# Altium footprint library PCB_PLC200.PcbLib: 15 footprints
Each footprint in its own frame and in the unit in brackets; x right, y up, seen from the top. Pads: shape width x height; smd on the part's side, far side on the other; paste and mask are expansions set on the pad; w line width, h text height; cw(c..) or ccw(c..) is an arc to the next point about the centre after c.
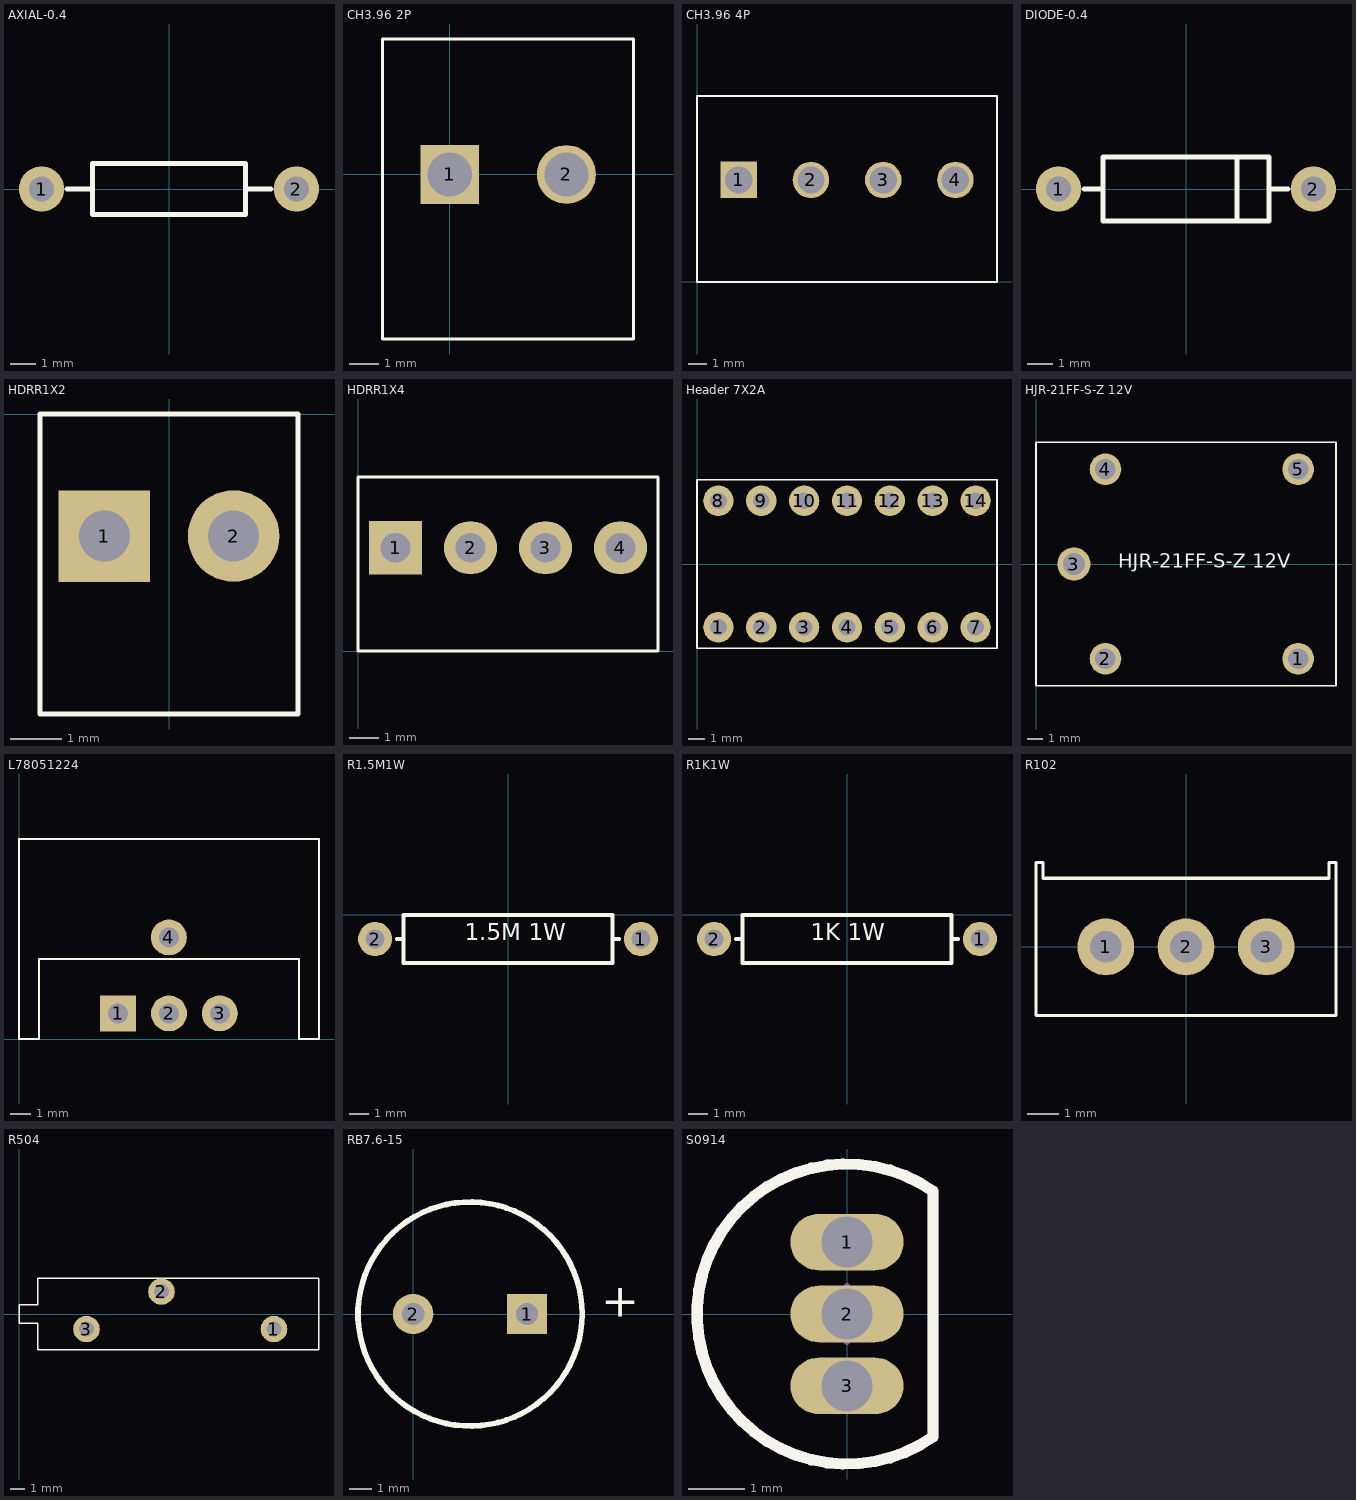
[diagram p0: the footprints below, top view; thin cyan lines are the x and y axes]

## AXIAL-0.4 [mm] "Axial Device, Thru-Hole; 2 Leads; 0.4 in Pin Spacing"
height 2.032
pads (2):
  round 1.8 hole 1: 1(-5.08,0) 2(5.08,0)
Top Overlay:
  lines w0.2: -4.064,0 -3.048,0 ; 3.048,0 4.064,0 ; -3.048,-1.016 3.048,-1.016 3.048,1.016 -3.048,1.016 -3.048,-1.016

## CH3.96 2P [mm]
height 6
pads (2):
  rect 2x2 hole 1.5: 1(0,0)
  round 2 hole 1.5: 2(3.96,0)
Top Overlay:
  lines w0.1: -2.286,2.413 -2.28,2.407 ; -2.28,-5.588 -2.28,4.6 6.24,4.6 6.24,-5.588 -2.28,-5.588

## CH3.96 4P [mm]
height 6
pads (4):
  rect 2x2 hole 1.5: 1(2.28,5.588)
  round 2 hole 1.5: 2(6.24,5.588) 3(10.2,5.588) 4(14.16,5.588)
Top Overlay:
  lines w0.1: -0.006,8.001 0,7.995 ; 0,0 16.44,0 16.44,10.188 0,10.188 0,0

## DIODE-0.4 [mm] "Diode, Thru-Hole; 2 Leads; 0.4 in Pin Spacing"
height 2.54
pads (2):
  round 1.8 hole 1: 1(-5.08,0) 2(5.08,0)
Top Overlay:
  lines w0.2: -4.064,0 -3.302,0 ; 2.032,-1.27 2.032,1.27 ; 3.302,0 4.064,0 ; -3.302,-1.27 3.302,-1.27 3.302,1.27 -3.302,1.27 -3.302,-1.27

## HDRR1X2 [mm] "Connector; Header; 2 Position"
height 6
pads (2):
  rect 1.8x1.8 hole 1: 1(-1.27,-2.4)
  round 1.8 hole 1: 2(1.27,-2.4)
Top Overlay:
  lines w0.1: -2.54,-5.9 2.54,-5.9 2.54,0 -2.54,0 -2.54,-5.9

## HDRR1X4 [mm] "Connector; Header; 4 Position"
height 6
pads (4):
  rect 1.8x1.8 hole 1: 1(1.27,3.5)
  round 1.8 hole 1: 2(3.81,3.5) 3(6.35,3.5) 4(8.89,3.5)
Top Overlay:
  lines w0.1: 0,0 0,5.9 10.16,5.9 10.16,0 0,0

## Header 7X2A [mm]
height 6
pads (14):
  round 1.8 hole 1: 1(1.27,-3.75) 2(3.81,-3.75) 3(6.35,-3.75) 4(8.89,-3.75) 5(11.43,-3.75) 6(13.97,-3.75) 7(16.51,-3.75) 8(1.27,3.75) 9(3.81,3.75) 10(6.35,3.75) 11(8.89,3.75) 12(11.43,3.75) 13(13.97,3.75) 14(16.51,3.75)
Top Overlay:
  lines w0.1: 0,-5 0,5 17.78,5 17.78,-5 0,-5

## HJR-21FF-S-Z 12V [mm]
height 6
pads (5):
  round 2 hole 1.3: 1(16.6,-6) 2(4.4,-6) 4(4.4,6) 5(16.6,6)
  round 2.1 hole 1.4: 3(2.4,0)
Top Overlay:
  lines w0.1: 0,-7.7 0,7.7 19,7.7 19,-7.7 0,-7.7
  text "HJR-21FF-S-Z 12V" at 5.207,-0.549 h1.52

## L78051224 [mm]
height 6
pads (4):
  rect 1.8x1.8 hole 1: 1(4.96,1.28)
  round 1.8 hole 1: 2(7.5,1.28) 3(10.04,1.28) 4(7.493,5.08)
Top Overlay:
  lines w0.1: 0,0 0,10 15,10 15,0 14,0 14,4 1,4 1,0 0,0

## R1.5M1W [mm] "Axial Device, Thru-Hole; 2 Leads; 0.3 in Pin Spacing"
height 1.524
pads (2):
  round 1.8 hole 1: 1(7,-1.27) 2(-7,-1.27)
Top Overlay:
  lines w0.2: -5.842,-1.27 -5.613,-1.27 ; 5.613,-1.27 5.842,-1.27 ; -5.5,-2.54 5.5,-2.54 5.5,0 -5.5,0 -5.5,-2.54
  text "1.5M 1W" at -2.286,-1.621 h1.52

## R1K1W [mm]
pads (2):
  round 1.8 hole 1: 1(7,-1.27) 2(-7,-1.27)
Top Overlay:
  lines w0.2: -5.842,-1.27 -5.613,-1.27 ; 5.613,-1.27 5.842,-1.27 ; -5.5,-2.54 5.5,-2.54 5.5,0 -5.5,0 -5.5,-2.54
  text "1K 1W" at -1.905,-1.621 h1.52

## R102 [mm] "Square Trimming Potentiometer"
height 6
pads (3):
  round 1.8 hole 1: 1(-2.54,0) 2(0,0) 3(2.54,0)
Top Overlay:
  lines w0.1: -4.75,-2.175 -4.75,2.675 -4.53,2.675 -4.53,2.175 4.53,2.175 4.53,2.675 4.75,2.675 4.75,-2.175 -4.75,-2.175

## R504 [mm]
height 6
pads (3):
  round 1.8 hole 1: 1(17.27,-1.015) 2(9.65,1.525) 3(4.57,-1.015)
Top Overlay:
  lines w0.1: 4.57,-2.415 1.27,-2.415 ; 1.27,-2.415 1.27,-0.635 0,-0.635 0,0.635 1.27,0.635 1.27,2.415 20.32,2.415 20.32,-2.415 1.27,-2.415

## RB7.6-15 [mm] "Polarized Capacitor (Radial); 2 Leads"
height 6
pads (2):
  rect 1.8x1.8 hole 1: 1(5.08,0)
  round 1.8 hole 1: 2(0,0)
Top Overlay:
  circle w0.254: c2.54,0 r5
  text "+" at 8.382,-0.618 h2.54

## S0914 [mm] "TO, Flat Index; 3 In-Line, Axial Leads; Body Dia. 4.8mm; Leads 0.55 x 0.51 mm (max)"
height 5.33
pads (3):
  oval 2x1 hole 0.9: 1(0,1.27) 2(0,0) 3(0,-1.27)
Top Overlay:
  lines w0.2: 1.52,-2.171 cw(c0,0) 1.52,2.171 1.52,-2.171
Mechanical 13:
  lines w0.2: 1.52,-2.171 cw(c0,0) 1.52,2.171 1.52,-2.171
Mechanical 15:
  lines w0.1: -0.5,0 0.5,0 ; 0,-0.5 0,0.5
3D body: height 5.33, standoff 0, extent -2.651,-2.661 1.52,2.661